# Altium footprint library General.PCBLIB: 130 footprints (part 2 of 9)
Each footprint in its own frame and in the unit in brackets; x right, y up, seen from the top. Pads: shape width x height; smd on the part's side, far side on the other; paste and mask are expansions set on the pad; w line width, h text height; cw(c..) or ccw(c..) is an arc to the next point about the centre after c.
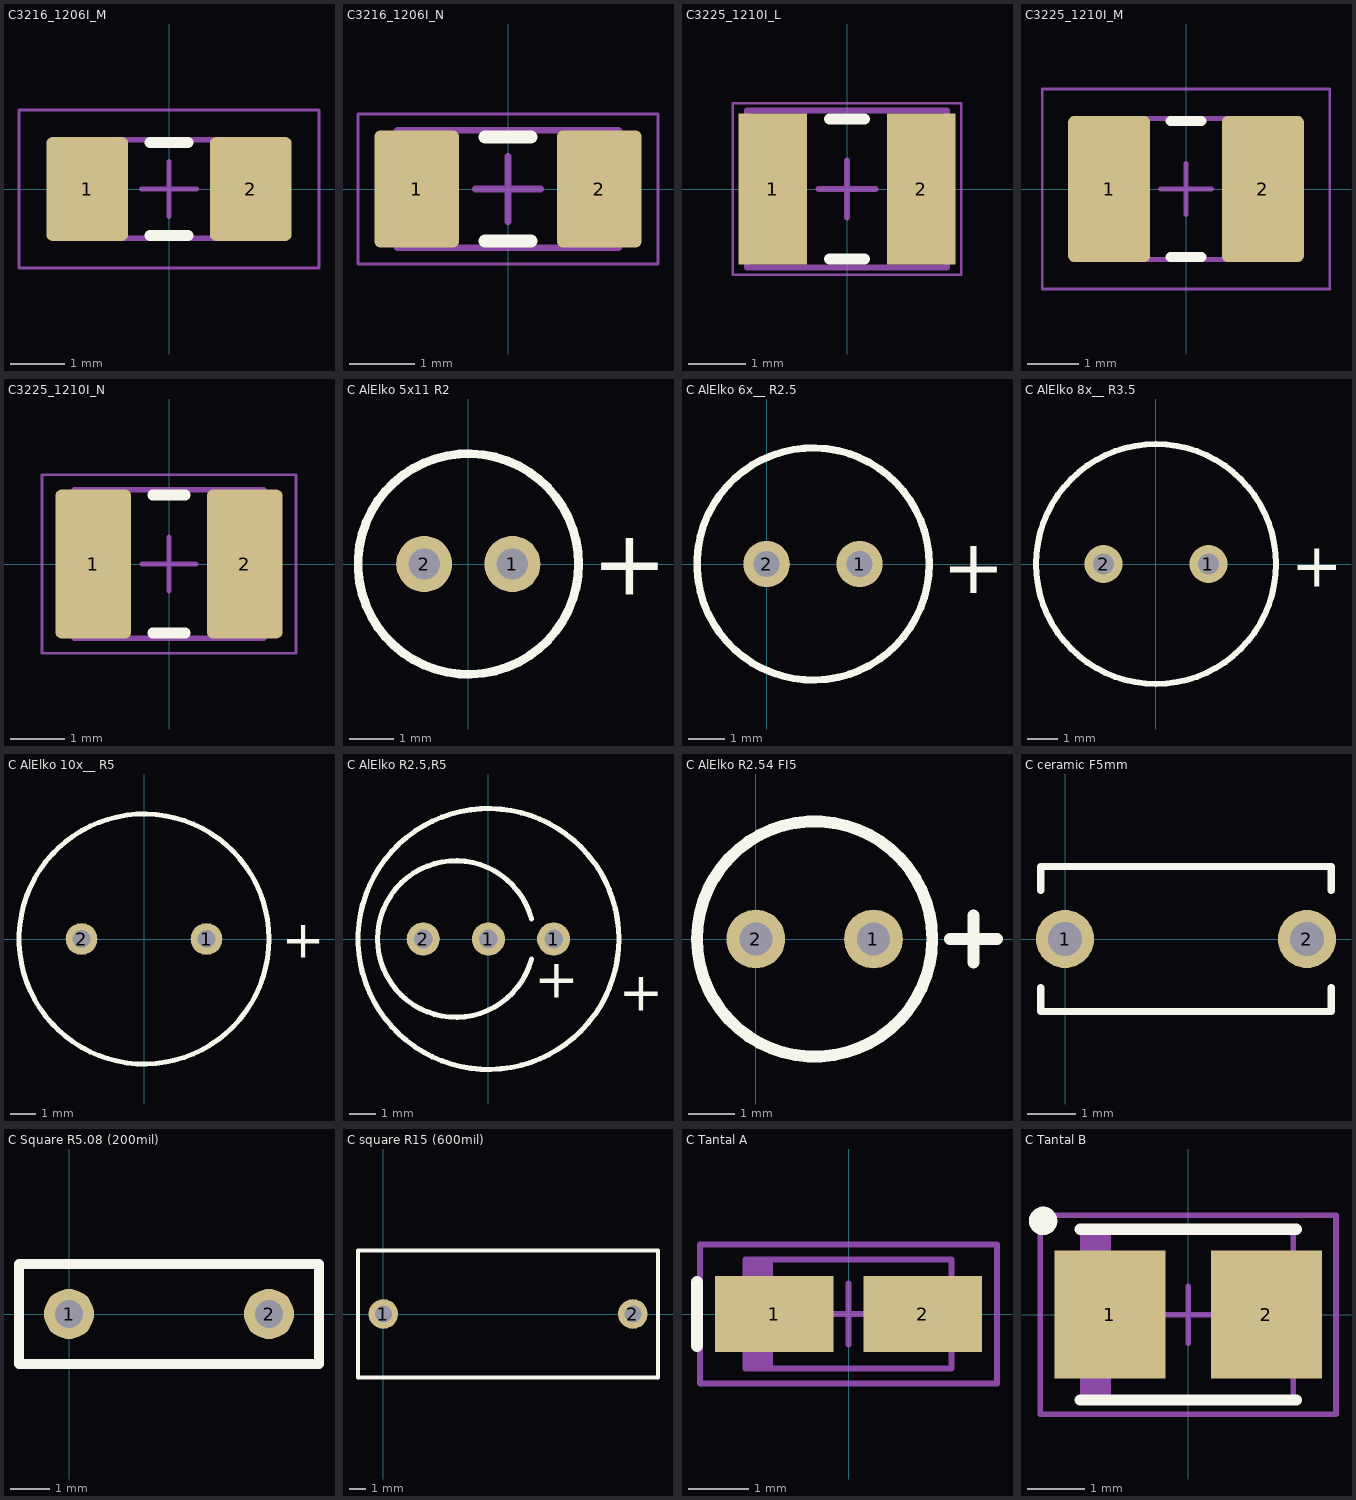
[diagram p1: the footprints below, top view; thin cyan lines are the x and y axes]

## C3216_1206I_M [mm] "Chip Capacitor, 2-Leads, Body 3.20x1.60mm, IPC Low Density"
height 1.8
pads (2):
  rrect15% 1.5x1.9 smd: 1(-1.5,0) 2(1.5,0)
Top Overlay:
  lines w0.2: -0.35,-0.85 0.35,-0.85 ; -0.35,0.85 0.35,0.85
Top Body, 3D Models:
  lines w0.1: -1.7,-0.9 -1.7,0.9 1.7,0.9 1.7,-0.9 -1.7,-0.9
Top Courtyard:
  lines w0.05: -2.75,-1.45 -2.75,1.45 2.75,1.45 2.75,-1.45 -2.75,-1.45
  lines w0.1: -0.5,0 0.5,0 ; 0,-0.5 0,0.5
Top DesignatorDoc:
  text ".Designator" at 0,0 h1.2
3D body "C1206(3216)_M.step": height 1.8, standoff 0, extent -1.7,-0.9 1.7,0.9

## C3216_1206I_N [mm] "Chip Capacitor, 2-Leads, Body 3.20x1.60mm, IPC Medium Density"
height 1.8
pads (2):
  rrect15% 1.3x1.8 smd: 1(-1.4,0) 2(1.4,0)
Top Overlay:
  lines w0.2: -0.35,-0.8 0.35,-0.8 ; -0.35,0.8 0.35,0.8
Top Body, 3D Models:
  lines w0.1: -1.7,-0.9 -1.7,0.9 1.7,0.9 1.7,-0.9 -1.7,-0.9
Top Courtyard:
  lines w0.05: -2.3,-1.15 -2.3,1.15 2.3,1.15 2.3,-1.15 -2.3,-1.15
  lines w0.1: -0.5,0 0.5,0 ; 0,-0.5 0,0.5
Top DesignatorDoc:
  text ".Designator" at 0,0 h1.2
3D body "C1206(3216)_N.step": height 1.8, standoff 0, extent -1.7,-0.9 1.7,0.9

## C3225_1210I_L [mm] "Chip Capacitor, 2-Leads, Body 3.20x2.50mm, IPC High Density"
height 2.8
pads (2):
  rect 1.2x2.65 smd: 1(-1.3,0) 2(1.3,0)
Top Overlay:
  lines w0.2: -0.3,-1.225 0.3,-1.225 ; -0.3,1.225 0.3,1.225
Top Body, 3D Models:
  lines w0.1: -1.75,-1.375 1.75,-1.375 1.75,1.375 -1.75,1.375 -1.75,-1.375
Top Courtyard:
  lines w0.05: -2,-1.5 2,-1.5 2,1.5 -2,1.5 -2,-1.5
  lines w0.1: -0.5,0 0.5,0 ; 0,-0.5 0,0.5
Top DesignatorDoc:
  text ".Designator" at 0,0 h1.2
3D body "C1210(3225)_L.step": height 2.8, standoff 0, extent -1.75,-1.375 1.75,1.375

## C3225_1210I_M [mm] "Chip Capacitor, 2-Leads, Body 3.20x2.50mm, IPC Low Density"
height 2.8
pads (2):
  rrect15% 1.6x2.85 smd: 1(-1.5,0) 2(1.5,0)
Top Overlay:
  lines w0.2: -0.3,-1.325 0.3,-1.325 ; -0.3,1.325 0.3,1.325
Top Body, 3D Models:
  lines w0.1: -1.75,-1.375 1.75,-1.375 1.75,1.375 -1.75,1.375 -1.75,-1.375
Top Courtyard:
  lines w0.05: -2.8,-1.95 2.8,-1.95 2.8,1.95 -2.8,1.95 -2.8,-1.95
  lines w0.1: -0.5,0 0.5,0 ; 0,-0.5 0,0.5
Top DesignatorDoc:
  text ".Designator" at 0,0 h1.2
3D body "C1210(3225)_M.step": height 2.8, standoff 0, extent -1.75,-1.375 1.75,1.375

## C3225_1210I_N [mm] "Chip Capacitor, 2-Leads, Body 3.20x2.50mm, IPC Medium Density"
height 2.8
pads (2):
  rrect15% 1.4x2.75 smd: 1(-1.4,0) 2(1.4,0)
Top Overlay:
  lines w0.2: -0.3,-1.275 0.3,-1.275 ; -0.3,1.275 0.3,1.275
Top Body, 3D Models:
  lines w0.1: -1.75,-1.375 1.75,-1.375 1.75,1.375 -1.75,1.375 -1.75,-1.375
Top Courtyard:
  lines w0.05: -2.35,-1.65 2.35,-1.65 2.35,1.65 -2.35,1.65 -2.35,-1.65
  lines w0.1: -0.5,0 0.5,0 ; 0,-0.5 0,0.5
Top DesignatorDoc:
  text ".Designator" at 0,0 h1.2
3D body "C1210(3225)_N.step": height 2.8, standoff 0, extent -1.75,-1.375 1.75,1.375

## C AlElko 5x11 R2 [mm]
height 12
pads (2):
  round 1.27 hole 0.711: 1(1,0) 2(-1,0)
Top Overlay:
  circle w0.2: c0,0 r2.5
  text "+" at 2.8,-0.7 h1.5
Top DesignatorDoc:
  text ".Designator" at 0,0 h1.2
3D body "User Library-Cap electrolitic radial 5x11.STEP": height 11.01, standoff -1.49, extent -2.499,-2.5 2.499,2.497

## C AlElko 6x__ R2.5 [mil]
height 393.7
pads (2):
  round 50 hole 28: 1(100,0) 2(0,0)
Top Overlay:
  circle w7.87: c50,0 r125
  text "+" at 188.98,-31.5 h59.06
Top DesignatorDoc:
  text ".Designator" at 50,0 h47.24
3D body "User Library-Cap electro 6_3x7x2_5mm.step": height 110.8, standoff -304.15, extent -75.01,-125.01 175.02,125.02

## C AlElko 8x__ R3.5 [mm]
height 10
pads (2):
  round 1.27 hole 0.711: 1(1.75,0) 2(-1.75,0)
Top Overlay:
  circle w0.2: c0,0 r4
  text "+" at 4.5,-0.75 h1.5
Top DesignatorDoc:
  text ".Designator" at 0,0 h1.2
3D body "User Library-Cap-EL(8x11_5-3_5).step": height 11.5, standoff -3.3, extent -4.002,-3.998 4,3.998

## C AlElko 10x__ R5 [mm]
height 10
pads (2):
  round 1.27 hole 0.711: 1(2.5,0) 2(-2.5,0)
Top Overlay:
  circle w0.2: c0,0 r5
  text "+" at 5.5,-0.75 h1.5
Top DesignatorDoc:
  text ".Designator" at 0,0 h1.2
3D body "User Library-Cap electrolitic radial 10x16.STEP": height 16.01, standoff -1.49, extent -4.998,-4.998 4.998,4.999

## C AlElko R2.5,R5 [mil]
height 393.7
pads (3):
  round 50 hole 28: 1(-0.01,-0.01) 1(98.43,0) 2(-98.43,0)
Top Overlay:
  circle w7.87: c0,0 r196.85
  lines w7.87: 64.88,-30.56 cw(c-49.21,0.01) 64.88,30.58
  text "+" at 196.85,-108.27 h59.06
  text "+" at 68.9,-88.58 h59.06
Top DesignatorDoc:
  text ".Designator" at -50,0 h47.24
3D body "User Library-Cap electrolitic radial 10x16.STEP": height 630.42, standoff -58.56, extent -196.78,-196.76 196.78,196.8

## C AlElko R2.54 FI5 [mil]
height 393.7
pads (2):
  round 50 hole 28: 1(100,0) 2(0,0)
Top Overlay:
  circle w10: c50,0 r100
  lines w10: 165,0 205,0 ; 185,-20 185,20
Top DesignatorDoc:
  text ".Designator" at 50,0 h47.24
3D body "User Library-Cap electro 6_3x7x2_5mm.step": height 110.8, standoff -304.15, extent -75.01,-125.01 175.02,125.02

## C ceramic F5mm [mm]
height 5
pads (2):
  round 1.2 hole 0.7: 1(0,0) 2(5,0)
Top Overlay:
  lines w0.15: -0.5,-1 -0.5,-1.5 5.5,-1.5 5.5,-1 ; -0.5,1 -0.5,1.5 5.5,1.5 5.5,1
Top DesignatorDoc:
  text ".Designator" at 2.54,0 h1.2
3D body "User Library-Cap ceramic F=5mm.STEP": height 5, standoff -4, extent -0.3,-1.25 5.3,1.25

## C Square R5.08 (200mil) [mil]
height 236.22
pads (2):
  round 50 hole 28: 1(0,0) 2(200,0)
Top Overlay:
  lines w10: -50,-50 250,-50 250,50 -50,50 -50,-50
Top DesignatorDoc:
  text ".Designator" at 100,0 h47.24
3D body "User Library-100n.step": height 299.21, standoff -181.1, extent -47.63,-49.21 247.64,49.22

## C square R15 (600mil) [mil]
height 590.55
pads (2):
  round 70 hole 40: 1(0,0) 2(590.55,0)
Top Overlay:
  lines w10: -60,-150 -60,150 650,150 650,-150 -60,-150
Top DesignatorDoc:
  text ".Designator" at 305,0 h47.24
3D body "User Library-cap_r60_pi3100d0j.step": height 532.1, standoff -688.37, extent -58.66,-147.63 650,147.64

## C Tantal A [mm] "Molded Capacitor, 2-Leads, Body 3,2x1,6mm, IPC Medium Density"
height 1.8
pads (2):
  rect 1.95x1.25 smd: 1(-1.225,0) 2(1.225,0)
Top Overlay:
  lines w0.2: -2.5,-0.525 -2.5,0.525
Top Body, 3D Models:
  rectangle: -1.7,-0.9 -1.243,0.9
  lines w0.1: -1.7,-0.9 -1.7,0.9 1.7,0.9 1.7,-0.9 -1.7,-0.9
Top Courtyard:
  lines w0.1: -0.5,0 0.5,0 ; 0,-0.5 0,0.5 ; -2.45,-1.15 -2.45,1.15 2.45,1.15 2.45,-1.15 -2.45,-1.15
Top DesignatorDoc:
  text ".Designator" at 0,0 h1.2
3D body "User Library-cap_a.step": height 1.63, standoff 0.02, extent -1.595,-0.813 1.595,0.787

## C Tantal B [mm] "Molded Capacitor, 2-Leads, Body 3,5x2,8mm, IPC Medium Density"
height 2.1
pads (2):
  rect 1.95x2.25 smd: 1(-1.375,0) 2(1.375,0)
Top Overlay:
  circle w0.25: c-2.55,1.65 r0.125
  lines w0.2: -1.9,-1.5 1.9,-1.5 ; -1.9,1.5 1.9,1.5
Top Body, 3D Models:
  rectangle: -1.85,-1.5 -1.352,1.5
  lines w0.1: -1.85,-1.5 1.85,-1.5 1.85,1.5 -1.85,1.5 -1.85,-1.5
Top Courtyard:
  lines w0.1: -0.5,0 0.5,0 ; 0,-0.5 0,0.5 ; -2.6,-1.75 2.6,-1.75 2.6,1.75 -2.6,1.75 -2.6,-1.75
Top DesignatorDoc:
  text ".Designator" at 0,0 h1.2
3D body "User Library-cap_b.step": height 1.93, standoff 0.02, extent -1.695,-1.397 1.797,1.403